# Altium footprint library 我的元件库01.PcbLib: 321 footprints (part 12 of 21)
Each footprint in its own frame and in the unit in brackets; x right, y up, seen from the top. Pads: shape width x height; smd on the part's side, far side on the other; paste and mask are expansions set on the pad; w line width, h text height; cw(c..) or ccw(c..) is an arc to the next point about the centre after c.
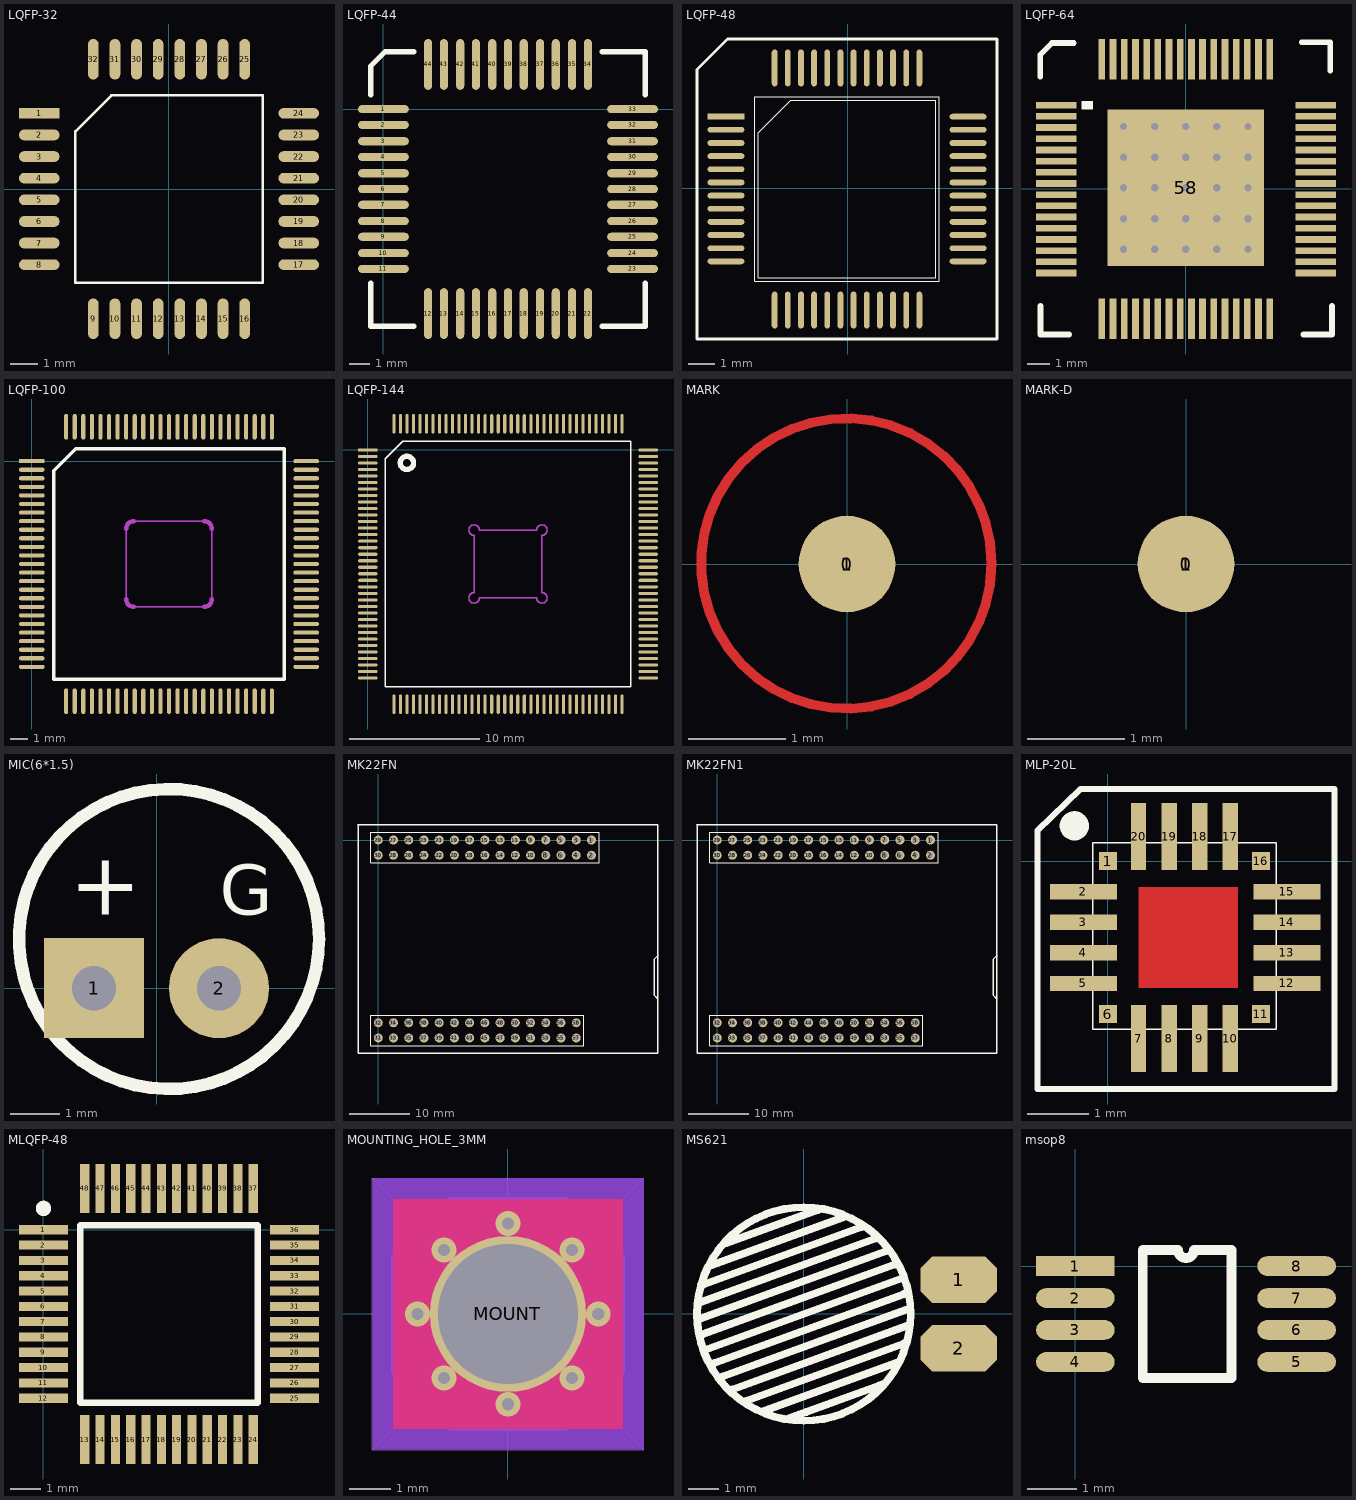
[diagram p11: the footprints below, top view; thin cyan lines are the x and y axes]

## LQFP-32 [mm]
pads (32):
  rect 1.5x0.4 smd: 1(-4.8,2.8)
  oval 1.5x0.4 smd: 2(-4.8,2) 3(-4.8,1.2) 4(-4.8,0.4) 5(-4.8,-0.4) 6(-4.8,-1.2) 7(-4.8,-2) 8(-4.8,-2.8) 17(4.8,-2.8) 18(4.8,-2) 19(4.8,-1.2) 20(4.8,-0.4) 21(4.8,0.4) 22(4.8,1.2) 23(4.8,2) 24(4.8,2.8)
  oval 0.4x1.5 smd: 9(-2.8,-4.8) 10(-2,-4.8) 11(-1.2,-4.8) 12(-0.4,-4.8) 13(0.4,-4.8) 14(1.2,-4.8) 15(2,-4.8) 16(2.8,-4.8) 25(2.8,4.8) 26(2,4.8) 27(1.2,4.8) 28(0.4,4.8) 29(-0.4,4.8) 30(-1.2,4.8) 31(-2,4.8) 32(-2.8,4.8)
Top Overlay:
  lines w0.1: -3.465,-3.465 3.465,-3.465 3.465,3.465 -2.13,3.465 -3.465,2.13 -3.465,-3.465
3D body "User Library-PQFP_32_P0_8.STEP": height 1.6, standoff -0.05, extent -4.495,-4.494 4.505,4.506

## LQFP-44 [mil]
pads (44):
  oval 100x16 smd: 1(0,0) 2(0,-31) 3(0,-63) 4(0,-94) 5(0,-126) 6(0,-157) 7(0,-188) 8(0,-220) 9(0,-251) 10(0,-283) 11(0,-314) 23(490,-314) 24(490,-283) 25(490,-251) 26(490,-220) 27(490,-188) 28(490,-157) 29(490,-126) 30(490,-94) 31(490,-63) 32(490,-31) 33(490,0)
  oval 16x100 smd: 12(88,-402) 13(119,-402) 14(151,-402) 15(182,-402) 16(214,-402) 17(245,-402) 18(276,-402) 19(308,-402) 20(339,-402) 21(371,-402) 22(402,-402) 34(402,88) 35(371,88) 36(339,88) 37(308,88) 38(276,88) 39(245,88) 40(214,88) 41(182,88) 42(151,88) 43(119,88) 44(88,88)
Top Overlay:
  lines w10: -25,-342 -25,-427 60,-427 ; -25,28 -25,85 3,113 60,113 ; 430,-427 515,-427 515,-342 ; 430,113 515,113 515,28
3D body "User Library-44 pin tqfp ic package.STEP": height 43.31, standoff -0.39, extent 9.56,-393.22 482,79.22

## LQFP-48 [mm]
height 1
pads (48):
  rect 1.4x0.22 smd: 1(-4.625,2.725)
  oval 1.4x0.22 smd: 2(-4.625,2.225) 3(-4.625,1.725) 4(-4.625,1.225) 5(-4.625,0.725) 6(-4.625,0.225) 7(-4.625,-0.275) 8(-4.625,-0.775) 9(-4.625,-1.275) 10(-4.625,-1.775) 11(-4.625,-2.275) 12(-4.625,-2.775) 25(4.575,-2.775) 26(4.575,-2.275) 27(4.575,-1.775) 28(4.575,-1.275) 29(4.575,-0.775) 30(4.575,-0.275) 31(4.575,0.225) 32(4.575,0.725) 33(4.575,1.225) 34(4.575,1.725) 35(4.575,2.225) 36(4.575,2.725)
  oval 0.22x1.4 smd: 13(-2.775,-4.625) 14(-2.275,-4.625) 15(-1.775,-4.625) 16(-1.275,-4.625) 17(-0.775,-4.625) 18(-0.275,-4.625) 19(0.225,-4.625) 20(0.725,-4.625) 21(1.225,-4.625) 22(1.725,-4.625) 23(2.225,-4.625) 24(2.725,-4.625) 37(2.725,4.575) 38(2.225,4.575) 39(1.725,4.575) 40(1.225,4.575) 41(0.725,4.575) 42(0.225,4.575) 43(-0.275,4.575) 44(-0.775,4.575) 45(-1.275,4.575) 46(-1.775,4.575) 47(-2.275,4.575) 48(-2.775,4.575)
Top Overlay:
  lines w0.025: -3.525,-3.525 -3.525,-0.025 -3.525,3.4 -3.525,3.475 3.475,3.475 3.475,-3.525 -3.525,-3.525 ; -3.39,-3.39 3.34,-3.39 3.34,3.34 -2.155,3.34 -3.39,2.105 -3.39,-3.39
  lines w0.102: -5.725,-5.725 -5.725,4.511 -4.561,5.675 5.675,5.675 5.675,-5.725 -5.725,-5.725
3D body "LQFP48-7x7.step": height 1.45, standoff 0, extent -4.525,-4.53 4.475,4.47

## LQFP-64 [mm]
pads (65):
  rect 1.8x0.3 smd: 1(-5.8,3.746) 2(-5.8,3.246) 3(-5.8,2.746) 4(-5.8,2.246) 5(-5.8,1.746) 6(-5.8,1.246) 7(-5.8,0.746) 8(-5.8,0.246) 9(-5.8,-0.254) 10(-5.8,-0.754) 11(-5.8,-1.254) 12(-5.8,-1.754) 13(-5.8,-2.254) 14(-5.8,-2.754) 15(-5.8,-3.254) 16(-5.8,-3.754) 33(5.8,-3.754) 34(5.8,-3.254) 35(5.8,-2.754) 36(5.8,-2.254) 37(5.8,-1.754) 38(5.8,-1.254) 39(5.8,-0.754) 40(5.8,-0.254) 41(5.8,0.246) 42(5.8,0.746) 43(5.8,1.246) 44(5.8,1.746) 45(5.8,2.246) 46(5.8,2.746) 47(5.8,3.246) 48(5.8,3.746)
  rect 0.3x1.8 smd: 17(-3.759,-5.8) 18(-3.259,-5.8) 19(-2.759,-5.8) 20(-2.259,-5.8) 21(-1.759,-5.8) 22(-1.259,-5.8) 23(-0.759,-5.8) 24(-0.259,-5.8) 25(0.241,-5.8) 26(0.741,-5.8) 27(1.241,-5.8) 28(1.741,-5.8) 29(2.241,-5.8) 30(2.741,-5.8) 31(3.241,-5.8) 32(3.741,-5.8) 49(3.741,5.8) 50(3.241,5.8) 51(2.741,5.8) 52(2.241,5.8) 53(1.741,5.8) 54(1.241,5.8) 55(0.741,5.8) 56(0.241,5.8) 57(-0.259,5.8) 58(-0.759,5.8) 59(-1.259,5.8) 60(-1.759,5.8) 61(-2.259,5.8) 62(-2.759,5.8) 63(-3.259,5.8) 64(-3.759,5.8)
  rect 7x7 smd: 58(-0.013,0.051)
via 2.769,2.794 diameter 0.66 hole 0.33
via 1.378,2.794 diameter 0.66 hole 0.33
via -0.013,2.794 diameter 0.66 hole 0.33
via -1.403,2.794 diameter 0.66 hole 0.33
via -2.794,2.794 diameter 0.66 hole 0.33
via 2.769,1.422 diameter 0.66 hole 0.33
via 2.769,0.051 diameter 0.66 hole 0.33
via 2.769,-1.321 diameter 0.66 hole 0.33
via 2.769,-2.692 diameter 0.66 hole 0.33
via 1.378,1.422 diameter 0.66 hole 0.33
via 1.378,0.051 diameter 0.66 hole 0.33
via 1.378,-1.321 diameter 0.66 hole 0.33
via 1.378,-2.692 diameter 0.66 hole 0.33
via -0.013,1.422 diameter 0.66 hole 0.33
via -0.013,-1.321 diameter 0.66 hole 0.33
via -1.403,1.422 diameter 0.66 hole 0.33
via -1.403,0.051 diameter 0.66 hole 0.33
via -1.403,-1.321 diameter 0.66 hole 0.33
via -2.794,-2.692 diameter 0.66 hole 0.33
via -2.794,1.422 diameter 0.66 hole 0.33
via -2.794,-1.321 diameter 0.66 hole 0.33
via -2.794,0.051 diameter 0.66 hole 0.33
via -1.403,-2.692 diameter 0.66 hole 0.33
via -0.013,-2.692 diameter 0.66 hole 0.33
via -0.013,0.051 diameter 0.66 hole 0.33
Top Overlay:
  rectangle: -4.658,3.55 -4.151,3.931
  lines w0.254: -6.517,5.017 -6.517,5.992 -5.984,6.525 -5.009,6.525 ; -6.502,-5.225 -6.502,-6.5 -5.227,-6.5 ; 5.166,6.553 6.441,6.553 6.441,5.278 ; 5.248,-6.5 6.523,-6.5 6.523,-5.225
3D body "S-PQFP-G64_Y.stp": height 1.58, standoff 0, extent -6.535,-6.53 6.515,6.521

## LQFP-100 [mm]
pads (100):
  rect 1.5x0.24 smd: 1(0,0)
  oval 1.5x0.24 smd: 2(0,-0.5) 3(0,-1) 4(0,-1.5) 5(0,-2) 6(0,-2.5) 7(0,-3) 8(0,-3.5) 9(0,-4) 10(0,-4.5) 11(0,-5) 12(0,-5.5) 13(0,-6) 14(0,-6.5) 15(0,-7) 16(0,-7.5) 17(0,-8) 18(0,-8.5) 19(0,-9) 20(0,-9.5) 21(0,-10) 22(0,-10.5) 23(0,-11) 24(0,-11.5) 25(0,-12) 51(16,-12) 52(16,-11.5) 53(16,-11) 54(16,-10.5) 55(16,-10) 56(16,-9.5) 57(16,-9) 58(16,-8.5) 59(16,-8) 60(16,-7.5) 61(16,-7) 62(16,-6.5) 63(16,-6) 64(16,-5.5) 65(16,-5) 66(16,-4.5) 67(16,-4) 68(16,-3.5) 69(16,-3) 70(16,-2.5) 71(16,-2) 72(16,-1.5) 73(16,-1) 74(16,-0.5) 75(16,0)
  oval 0.24x1.5 smd: 26(2,-14) 27(2.5,-14) 28(3,-14) 29(3.5,-14) 30(4,-14) 31(4.5,-14) 32(5,-14) 33(5.5,-14) 34(6,-14) 35(6.5,-14) 36(7,-14) 37(7.5,-14) 38(8,-14) 39(8.5,-14) 40(9,-14) 41(9.5,-14) 42(10,-14) 43(10.5,-14) 44(11,-14) 45(11.5,-14) 46(12,-14) 47(12.5,-14) 48(13,-14) 49(13.5,-14) 50(14,-14) 76(14,2) 77(13.5,2) 78(13,2) 79(12.5,2) 80(12,2) 81(11.5,2) 82(11,2) 83(10.5,2) 84(10,2) 85(9.5,2) 86(9,2) 87(8.5,2) 88(8,2) 89(7.5,2) 90(7,2) 91(6.5,2) 92(6,2) 93(5.5,2) 94(5,2) 95(4.5,2) 96(4,2) 97(3.5,2) 98(3,2) 99(2.5,2) 100(2,2)
Top Overlay:
  lines w0.2: 1.285,-12.715 1.285,-0.57 2.57,0.715 14.715,0.715 14.715,-12.715 1.285,-12.715
Keep-Out Layer:
  lines w0.1: 5.5,-8.05 5.5,-3.95 ; 5.95,-8.5 10.05,-8.5 ; 5.95,-3.5 10.05,-3.5 ; 10.5,-8.05 10.5,-3.95
  lines w0.254: 5.5,-8.05 ccw(c5.95,-8.05) 5.95,-8.5 ; 5.5,-3.95 cw(c5.95,-3.95) 5.95,-3.5 ; 10.05,-8.5 ccw(c10.05,-8.05) 10.5,-8.05 ; 10.05,-3.5 cw(c10.05,-3.95) 10.5,-3.95
Mechanical 1:
  lines w0.1: 5.5,-8.05 5.5,-3.95 ; 5.95,-8.5 10.05,-8.5 ; 5.95,-3.5 10.05,-3.5 ; 10.5,-8.05 10.5,-3.95
  lines w0.254: 5.5,-8.05 ccw(c5.95,-8.05) 5.95,-8.5 ; 5.5,-3.95 cw(c5.95,-3.95) 5.95,-3.5 ; 10.05,-8.5 ccw(c10.05,-8.05) 10.5,-8.05 ; 10.05,-3.5 cw(c10.05,-3.95) 10.5,-3.95
3D body "SW3dPS-TQFP100-1.STEP": height 1.61, standoff -0.01, extent 0,-13.993 16,2.007

## LQFP-144 [mm]
pads (144):
  rect 1.5x0.24 smd: 1(0,0)
  oval 1.5x0.24 smd: 2(0,-0.5) 3(0,-1) 4(0,-1.5) 5(0,-2) 6(0,-2.5) 7(0,-3) 8(0,-3.5) 9(0,-4) 10(0,-4.5) 11(0,-5) 12(0,-5.5) 13(0,-6) 14(0,-6.5) 15(0,-7) 16(0,-7.5) 17(0,-8) 18(0,-8.5) 19(0,-9) 20(0,-9.5) 21(0,-10) 22(0,-10.5) 23(0,-11) 24(0,-11.5) 25(0,-12) 26(0,-12.5) 27(0,-13) 28(0,-13.5) 29(0,-14) 30(0,-14.5) 31(0,-15) 32(0,-15.5) 33(0,-16) 34(0,-16.5) 35(0,-17) 36(0,-17.5) 73(21.5,-17.5) 74(21.5,-17) 75(21.5,-16.5) 76(21.5,-16) 77(21.5,-15.5) 78(21.5,-15) 79(21.5,-14.5) 80(21.5,-14) 81(21.5,-13.5) 82(21.5,-13) 83(21.5,-12.5) 84(21.5,-12) 85(21.5,-11.5) 86(21.5,-11) 87(21.5,-10.5) 88(21.5,-10) 89(21.5,-9.5) 90(21.5,-9) 91(21.5,-8.5) 92(21.5,-8) 93(21.5,-7.5) 94(21.5,-7) 95(21.5,-6.5) 96(21.5,-6) 97(21.5,-5.5) 98(21.5,-5) 99(21.5,-4.5) 100(21.5,-4) 101(21.5,-3.5) 102(21.5,-3) 103(21.5,-2.5) 104(21.5,-2) 105(21.5,-1.5) 106(21.5,-1) 107(21.5,-0.5) 108(21.5,0)
  oval 0.24x1.5 smd: 37(2,-19.5) 38(2.5,-19.5) 39(3,-19.5) 40(3.5,-19.5) 41(4,-19.5) 42(4.5,-19.5) 43(5,-19.5) 44(5.5,-19.5) 45(6,-19.5) 46(6.5,-19.5) 47(7,-19.5) 48(7.5,-19.5) 49(8,-19.5) 50(8.5,-19.5) 51(9,-19.5) 52(9.5,-19.5) 53(10,-19.5) 54(10.5,-19.5) 55(11,-19.5) 56(11.5,-19.5) 57(12,-19.5) 58(12.5,-19.5) 59(13,-19.5) 60(13.5,-19.5) 61(14,-19.5) 62(14.5,-19.5) 63(15,-19.5) 64(15.5,-19.5) 65(16,-19.5) 66(16.5,-19.5) 67(17,-19.5) 68(17.5,-19.5) 69(18,-19.5) 70(18.5,-19.5) 71(19,-19.5) 72(19.5,-19.5) 109(19.5,2) 110(19,2) 111(18.5,2) 112(18,2) 113(17.5,2) 114(17,2) 115(16.5,2) 116(16,2) 117(15.5,2) 118(15,2) 119(14.5,2) 120(14,2) 121(13.5,2) 122(13,2) 123(12.5,2) 124(12,2) 125(11.5,2) 126(11,2) 127(10.5,2) 128(10,2) 129(9.5,2) 130(9,2) 131(8.5,2) 132(8,2) 133(7.5,2) 134(7,2) 135(6.5,2) 136(6,2) 137(5.5,2) 138(5,2) 139(4.5,2) 140(4,2) 141(3.5,2) 142(3,2) 143(2.5,2) 144(2,2)
Top Overlay:
  circle w0.406: c3,-1 r0.508
  lines w0.1: 1.335,-18.165 20.165,-18.165 20.165,0.665 2.67,0.665 1.335,-0.67 1.335,-18.165
Keep-Out Layer:
  lines w0.1: 12.95,-11.35 ccw(c13.35,-11.35) 13.35,-10.95 ; 12.954,-11.35 8.55,-11.35 cw(c8.15,-11.35) 8.15,-10.95 8.15,-6.55 cw(c8.15,-6.15) 8.55,-6.15 12.95,-6.15 cw(c13.35,-6.15) 13.35,-6.55 13.35,-10.922
Mechanical 1:
  lines w0.1: 12.95,-11.35 ccw(c13.35,-11.35) 13.35,-10.95 ; 12.954,-11.35 8.55,-11.35 cw(c8.15,-11.35) 8.15,-10.95 8.15,-6.55 cw(c8.15,-6.15) 8.55,-6.15 12.95,-6.15 cw(c13.35,-6.15) 13.35,-6.55 13.35,-10.922

## MARK [mm]
pads (2):
  round 3.1 on Top Solder: 0(0,0)
  round 1 smd: 1(0,0)
Top Layer:
  circle w0.1: c-0.007,0.005 r1.5

## MARK-D [mm]
pads (3):
  round 3.1 on Top Solder: 0(0,0)
  round 3.1 on Bottom Solder: 1(0,0)
  round 1 all layers, no hole: 1(0,0)
Multi-Layer:
  circle w0.1: c-0.007,0.005 r1.5

## MIC(6*1.5) [mil]
pads (2):
  rect 80x80 hole 35.43: 1(-50,0)
  round 80 hole 35.43: 2(50,0)
Top Overlay:
  circle w10: c10,39.37 r120
  text "G" at 50.46,58.89 h40
  text "+" at -69.54,58.89 h50

## MK22FN [mm]
pads (58):
  round 1.5 hole 0.9: 1(35.56,0) 2(35.56,-2.54) 3(33.02,0) 4(33.02,-2.54) 5(30.48,0) 6(30.48,-2.54) 7(27.94,0) 8(27.94,-2.54) 9(25.4,0) 10(25.4,-2.54) 11(22.86,0) 12(22.86,-2.54) 13(20.32,0) 14(20.32,-2.54) 15(17.78,0) 16(17.78,-2.54) 17(15.24,0) 18(15.24,-2.54) 19(12.7,0) 20(12.7,-2.54) 21(10.16,0) 22(10.16,-2.54) 23(7.62,0) 24(7.62,-2.54) 25(5.08,0) 26(5.08,-2.54) 27(2.54,0) 28(2.54,-2.54) 29(0,0) 30(0,-2.54) 31(0,-33.02) 32(0,-30.48) 33(2.54,-33.02) 34(2.54,-30.48) 35(5.08,-33.02) 36(5.08,-30.48) 37(7.62,-33.02) 38(7.62,-30.48) 39(10.16,-33.02) 40(10.16,-30.48) 41(12.7,-33.02) 42(12.7,-30.48) 43(15.24,-33.02) 44(15.24,-30.48) 45(17.78,-33.02) 46(17.78,-30.48) 47(20.32,-33.02) 48(20.32,-30.48) 49(22.86,-33.02) 50(22.86,-30.48) 51(25.4,-33.02) 52(25.4,-30.48) 53(27.94,-33.02) 54(27.94,-30.48) 55(30.48,-33.02) 56(30.48,-30.48) 57(33.02,-33.02) 58(33.02,-30.48)
Top Overlay:
  lines w0.2: -1.27,-34.29 -1.27,-29.21 34.29,-29.21 34.29,-34.29 -1.27,-34.29 ; -1.27,-3.81 36.83,-3.81 36.83,1.27 -1.27,1.27 -1.27,-3.81
  lines w0.254: -3.378,2.54 46.634,2.54 ; -3.366,2.515 -3.366,-35.56 46.609,-35.56 ; 46.634,-26.467 45.999,-25.832 45.999,-19.939 46.66,-19.279 ; 46.647,-35.56 46.647,2.515
3D body "pin_header_awl254-dg-g30d.stp": height 14.24, standoff 2.74, extent -1.27,-3.835 36.83,1.245
3D body "female_header_a-bl254-dg-g30d.stp": height 8.5, standoff -3.2, extent -1.395,-3.77 36.955,1.23
3D body "female_header_a-bl254-dg-g28d.stp": height 8.5, standoff -3.2, extent -1.372,-34.225 34.438,-29.225
3D body "pin_header_awl254-dg-g28d.stp": height 14.24, standoff 2.74, extent -1.27,-34.315 34.29,-29.235
3D body "2014核心板 单个2 .step": height 20.74, standoff 9.04, extent -3.353,-35.611 46.634,2.508
3D body "pin_header_awl254-dg-g06d.stp": height 20.74, standoff 9.24, extent 41.224,-15.977 46.304,-8.357

## MK22FN1 [mm]
pads (58):
  round 1.5 hole 0.9: 1(35.56,0) 2(35.56,-2.54) 3(33.02,0) 4(33.02,-2.54) 5(30.48,0) 6(30.48,-2.54) 7(27.94,0) 8(27.94,-2.54) 9(25.4,0) 10(25.4,-2.54) 11(22.86,0) 12(22.86,-2.54) 13(20.32,0) 14(20.32,-2.54) 15(17.78,0) 16(17.78,-2.54) 17(15.24,0) 18(15.24,-2.54) 19(12.7,0) 20(12.7,-2.54) 21(10.16,0) 22(10.16,-2.54) 23(7.62,0) 24(7.62,-2.54) 25(5.08,0) 26(5.08,-2.54) 27(2.54,0) 28(2.54,-2.54) 29(0,0) 30(0,-2.54) 31(0,-33.02) 32(0,-30.48) 33(2.54,-33.02) 34(2.54,-30.48) 35(5.08,-33.02) 36(5.08,-30.48) 37(7.62,-33.02) 38(7.62,-30.48) 39(10.16,-33.02) 40(10.16,-30.48) 41(12.7,-33.02) 42(12.7,-30.48) 43(15.24,-33.02) 44(15.24,-30.48) 45(17.78,-33.02) 46(17.78,-30.48) 47(20.32,-33.02) 48(20.32,-30.48) 49(22.86,-33.02) 50(22.86,-30.48) 51(25.4,-33.02) 52(25.4,-30.48) 53(27.94,-33.02) 54(27.94,-30.48) 55(30.48,-33.02) 56(30.48,-30.48) 57(33.02,-33.02) 58(33.02,-30.48)
Top Overlay:
  lines w0.2: -1.27,-34.29 34.29,-34.29 34.29,-29.21 -1.27,-29.21 -1.27,-34.29 ; -1.27,-3.81 -1.27,1.27 36.83,1.27 36.83,-3.81 -1.27,-3.81
  lines w0.254: -3.378,2.54 46.634,2.54 ; -3.366,2.515 -3.366,-35.56 46.609,-35.56 ; 46.634,-26.467 45.999,-25.832 45.999,-19.939 46.66,-19.279 ; 46.647,-35.56 46.647,2.515
3D body "pin_header_awl254-dg-g30d.stp": height 14.24, standoff 2.74, extent -1.27,-3.81 36.83,1.27
3D body "female_header_a-bl254-dg-g30d.stp": height 8.5, standoff -3.2, extent -1.395,-3.759 36.955,1.241
3D body "female_header_a-bl254-dg-g04d.stp": height 8.5, standoff -3.2, extent -1.369,-34.25 3.961,-29.25
3D body "female_header_a-bl254-dg-g04d.stp": height 8.5, standoff -3.2, extent 29.085,-34.275 34.415,-29.275
3D body "pin_header_awl254-dg-g04d.stp": height 14.24, standoff 2.74, extent -1.244,-34.29 3.836,-29.21
3D body "pin_header_awl254-dg-g04d.stp": height 14.24, standoff 2.74, extent 29.185,-34.315 34.265,-29.235
3D body "pin_header_awl254-dg-g06d.stp": height 20.74, standoff 9.24, extent 41.224,-15.977 46.304,-8.357
3D body "2014核心板 单个2 .step": height 20.74, standoff 9.04, extent -3.353,-35.611 46.634,2.508

## MLP-20L [mm]
pads (20):
  rect 0.3x0.3 smd: 1(0,0) 6(0,-2.5) 11(2.5,-2.5) 16(2.5,0)
  rect 1.1x0.25 smd: 2(-0.4,-0.5) 3(-0.4,-1) 4(-0.4,-1.5) 5(-0.4,-2) 12(2.925,-2) 13(2.925,-1.5) 14(2.925,-1) 15(2.925,-0.5)
  rect 0.25x1.1 smd: 7(0.5,-2.9) 8(1,-2.9) 9(1.5,-2.9) 10(2,-2.9) 17(2,0.4) 18(1.5,0.4) 19(1,0.4) 20(0.5,0.4)
Top Layer:
  region: 0.499,-0.425 0.499,-2.075 2.125,-2.075 2.125,-0.425
Top Overlay:
  circle w0.254: c-0.55,0.575 r0.112
  lines w0.025: -0.25,-2.75 2.75,-2.75 2.75,0.3 -0.25,0.3 -0.25,-2.75
  lines w0.1: -1.15,-3.725 -1.15,0.5 -0.45,1.175 ; -1.141,-3.721 3.7,-3.725 3.7,1.175 -0.434,1.177

## MLQFP-48 [mm]
pads (48):
  rect 1.6x0.3 smd: 1(0,0) 2(0,-0.5) 3(0,-1) 4(0,-1.5) 5(0,-2) 6(0,-2.5) 7(0,-3) 8(0,-3.5) 9(0,-4) 10(0,-4.5) 11(0,-5) 12(0,-5.5) 25(8.2,-5.5) 26(8.2,-5) 27(8.2,-4.5) 28(8.2,-4) 29(8.2,-3.5) 30(8.2,-3) 31(8.2,-2.5) 32(8.2,-2) 33(8.2,-1.5) 34(8.2,-1) 35(8.2,-0.5) 36(8.2,0)
  rect 0.3x1.6 smd: 13(1.35,-6.85) 14(1.85,-6.85) 15(2.35,-6.85) 16(2.85,-6.85) 17(3.35,-6.85) 18(3.85,-6.85) 19(4.35,-6.85) 20(4.85,-6.85) 21(5.35,-6.85) 22(5.85,-6.85) 23(6.35,-6.85) 24(6.85,-6.85) 37(6.85,1.35) 38(6.35,1.35) 39(5.85,1.35) 40(5.35,1.35) 41(4.85,1.35) 42(4.35,1.35) 43(3.85,1.35) 44(3.35,1.35) 45(2.85,1.35) 46(2.35,1.35) 47(1.85,1.35) 48(1.35,1.35)
Top Overlay:
  circle w0.25: c0,0.7 r0.125
  lines w0.2: 1.2,-5.65 1.2,0.15 7,0.15 7,-5.65 1.2,-5.65

## MOUNTING_HOLE_3MM [mm] "Non-plated mounting hole for 3mm screw"
height 3.5
pads (1):
  round 3.8 hole 3.4: MOUNT(0,0)
via 1.556,1.556 diameter 0.6 hole 0.3
via 2.2,0 diameter 0.6 hole 0.3
via 1.556,-1.556 diameter 0.6 hole 0.3
via 0,-2.2 diameter 0.6 hole 0.3
via -1.556,-1.556 diameter 0.6 hole 0.3
via -2.2,0 diameter 0.6 hole 0.3
via -1.556,1.556 diameter 0.6 hole 0.3
via 0,2.2 diameter 0.6 hole 0.3
Top Layer:
  circle w1: c0,0 r2.3
  rectangle: -2.8,-2.8 2.8,2.8
Top Layer keep-out:
  rectangle: -3.3,-3.3 3.3,3.3
Bottom Layer:
  rectangle: -2.8,-2.8 2.8,2.8
Bottom Layer keep-out:
  rectangle: -3.3,-3.3 3.3,3.3
Top Solder:
  rectangle: -3.2,-3.2 3.2,3.2
Bottom Solder:
  rectangle: -3,-3 3,3
Keep-Out Layer:
  circle w1.2: c0,0 r2.5
Mechanical 2:
  lines w0.025: -3.3,-3.3 -3.3,3.3 ; -3.3,-3.3 3.3,-3.3 ; -3.3,-3.3 0,0 ; -3.3,3.3 0,0 ; -3.3,3.3 3.3,3.3 ; 0,0 3.3,3.3 ; 0,0 3.3,-3.3 ; 3.3,-3.3 3.3,3.3
Mechanical 7:
  circle w0.1: c0,0.002 r2.7
  circle w1.2: c0,0 r2.2
  rectangle: 0.5,0.8 1.6,1.6
  region: 1.6,0.5 1.6,1.6 0.8,1.6 0.8,0.5
  region: 0.5,0.8 0.8,0.5 1.366,1.066 1.066,1.366
  region: -0.8,0.5 -0.8,1.6 -1.6,1.6 -1.6,0.5
  region: -0.5,1.6 -1.6,1.6 -1.6,0.8 -0.5,0.8
  region: -0.8,0.5 -0.5,0.8 -1.066,1.366 -1.366,1.066
  region: -0.5,-0.8 -1.6,-0.8 -1.6,-1.6 -0.5,-1.6
  region: -1.6,-0.5 -1.6,-1.6 -0.8,-1.6 -0.8,-0.5
  region: -0.5,-0.8 -0.8,-0.5 -1.366,-1.066 -1.066,-1.366
  region: 0.8,-0.5 0.8,-1.6 1.6,-1.6 1.6,-0.5
  rectangle: 0.5,-1.6 1.6,-0.8
  region: 0.8,-0.5 0.5,-0.8 1.066,-1.366 1.366,-1.066
Mechanical 8:
  circle w0.6: c0,0 r2
  rectangle: 1.7,-1.401 2.8,1.399
  region: -1.951,-0.551 -2.8,-1.4 -1.4,-2.8 -0.551,-1.951
  region: -0.551,1.951 -1.4,2.8 -2.8,1.4 -1.951,0.551
  region: 1.951,0.551 2.8,1.4 1.4,2.8 0.551,1.951
  region: 0.551,-1.951 1.4,-2.8 2.8,-1.4 1.951,-0.551
  region: -1.401,-1.7 -1.401,-2.8 1.399,-2.8 1.399,-1.7
  region: 1.4,1.699 1.4,2.799 -1.4,2.799 -1.4,1.699
  rectangle: -2.8,-1.4 -1.7,1.4
  lines w0.1: -2.8,-1.4 -1.4,-2.8 1.4,-2.8 2.8,-1.4 2.8,1.4 1.4,2.8 -1.4,2.8 -2.8,1.4 -2.8,-1.4

## MS621 [mm]
pads (2):
  oct 2.5x1.524 smd: 1(5.082,1.11) 2(5.082,-1.122)
Top Overlay:
  circle w0.254: c0.002,-0.006 r3.5
  lines w0.254: -3.398,-0.162 2.706,2.06 ; -3.384,0.384 2.345,2.469 ; -3.318,-0.673 2.974,1.617 ; -3.287,-1.203 3.244,1.174 ; -3.281,0.962 1.895,2.846 ; -3.028,1.595 1.294,3.168 ; -2.926,-1.612 3.276,0.646 ; -2.658,-2.055 3.356,0.134 ; -2.544,2.311 0.463,3.406 ; -2.341,-2.48 3.387,-0.395 ; -1.888,-2.856 3.281,-0.975 ; -1.291,-3.179 3.032,-1.606 ; -0.482,-3.425 2.57,-2.314 ; 0.089,-3.217 2.476,-2.349

## msop8 [mm]
height 1.1
pads (8):
  rect 1.6x0.4 smd: 1(0,0)
  oval 1.6x0.4 smd: 2(0,-0.65) 3(0,-1.3) 4(0,-1.95) 5(4.5,-1.95) 6(4.5,-1.3) 7(4.5,-0.65) 8(4.5,0)
Top Overlay:
  lines w0.2: 1.372,-2.275 1.372,0.325 2.088,0.325 ccw(c2.25,0.325) 2.412,0.325 3.175,0.325 3.175,-2.275 1.372,-2.275
3D body "User Library-MSOP8.step": height 1.05, standoff -0.05, extent -0.208,-2.515 4.729,0.585